# Altium integrated library Weidmueller_OMNIMATE_Power.IntLib: 508 symbols (part 1 of 9) (continued)
## 1043310000 (continued)
OMNIMATE Power - series BL/SL 7.62HP; PartNumber: 1043310000; Manufacturer: Weidmueller; Short_text_for_material: BLL 7.62HP/02/90F 3.2SN OR BX; Side_termination_characteristic: Flange; Mounting_onto_the_PCB: Solder connection; Pitch_mm: 7.62 mm; Pitch_inch: 0.3 inch; No_of_poles: 2; Outgoing_elbow: 90°; Solder_pin_length_mm: 3.2 mm; Contact_surface: tinned; Insulating_material: PA GF; UL_94_flammability_rating: V-0; Rated_voltage_for_surge_voltage_class_pollution_degree_II_2: 630 V; Rated_current_min_no_of_poles_TU_20_deg_C: 24 A; Rated_voltage_use_group_B_UL_1059: 300 V; Rated_current_use_group_B_UL_1059: 20 A; PackageReference: BLL_7_62HP_90F_02; Colour: Orange; Packaging: Box; Qty: 72 PCS; Revision: V1; ComponentLink1Description: Manufacturer URL; ComponentLink1URL: http://www.weidmueller.com/; ComponentLink2Description: URL Link1; ComponentLink2URL: http://catalog.weidmueller.com/catalog/Start.do?localeId=en&ObjectID=1043310000
footprint BLL_7_62HP_90F_02 (OMNIMATE Power - Serie BL/SL 7.62HP  BLL 7.62HP/02/90F 3.2)
pins: A1, A2

## 1043310000_Single
designator J?
OMNIMATE Power - series BL/SL 7.62HP; PartNumber: 1043310000; Manufacturer: Weidmueller; Short_text_for_material: BLL 7.62HP/02/90F 3.2SN OR BX; Side_termination_characteristic: Flange; Mounting_onto_the_PCB: Solder connection; Pitch_mm: 7.62 mm; Pitch_inch: 0.3 inch; No_of_poles: 2; Outgoing_elbow: 90°; Solder_pin_length_mm: 3.2 mm; Contact_surface: tinned; Insulating_material: PA GF; UL_94_flammability_rating: V-0; Rated_voltage_for_surge_voltage_class_pollution_degree_II_2: 630 V; Rated_current_min_no_of_poles_TU_20_deg_C: 24 A; Rated_voltage_use_group_B_UL_1059: 300 V; Rated_current_use_group_B_UL_1059: 20 A; PackageReference: BLL_7_62HP_90F_02; Colour: Orange; Packaging: Box; Qty: 72 PCS; Revision: V1; ComponentLink1Description: Manufacturer URL; ComponentLink1URL: http://www.weidmueller.com/; ComponentLink2Description: URL Link1; ComponentLink2URL: http://catalog.weidmueller.com/catalog/Start.do?localeId=en&ObjectID=1043310000
footprint BLL_7_62HP_90F_02 (OMNIMATE Power - Serie BL/SL 7.62HP  BLL 7.62HP/02/90F 3.2)
part A pins: A1
part B pins: A2

## 1043320000
designator J?
OMNIMATE Power - series BL/SL 7.62HP; PartNumber: 1043320000; Manufacturer: Weidmueller; Short_text_for_material: BLL 7.62HP/03/90F 3.2SN OR BX; Side_termination_characteristic: Flange; Mounting_onto_the_PCB: Solder connection; Pitch_mm: 7.62 mm; Pitch_inch: 0.3 inch; No_of_poles: 3; Outgoing_elbow: 90°; Solder_pin_length_mm: 3.2 mm; Contact_surface: tinned; Insulating_material: PA GF; UL_94_flammability_rating: V-0; Rated_voltage_for_surge_voltage_class_pollution_degree_II_2: 630 V; Rated_current_min_no_of_poles_TU_20_deg_C: 24 A; Rated_voltage_use_group_B_UL_1059: 300 V; Rated_current_use_group_B_UL_1059: 20 A; PackageReference: BLL_7_62HP_90F_03; Colour: Orange; Packaging: Box; Qty: 54 PCS; Revision: V1; ComponentLink1Description: Manufacturer URL; ComponentLink1URL: http://www.weidmueller.com/; ComponentLink2Description: URL Link1; ComponentLink2URL: http://catalog.weidmueller.com/catalog/Start.do?localeId=en&ObjectID=1043320000
footprint BLL_7_62HP_90F_03 (OMNIMATE Power - Serie BL/SL 7.62HP  BLL 7.62HP/03/90F 3.2)
pins: A1, A2, A3

## 1043320000_Single
designator J?
OMNIMATE Power - series BL/SL 7.62HP; PartNumber: 1043320000; Manufacturer: Weidmueller; Short_text_for_material: BLL 7.62HP/03/90F 3.2SN OR BX; Side_termination_characteristic: Flange; Mounting_onto_the_PCB: Solder connection; Pitch_mm: 7.62 mm; Pitch_inch: 0.3 inch; No_of_poles: 3; Outgoing_elbow: 90°; Solder_pin_length_mm: 3.2 mm; Contact_surface: tinned; Insulating_material: PA GF; UL_94_flammability_rating: V-0; Rated_voltage_for_surge_voltage_class_pollution_degree_II_2: 630 V; Rated_current_min_no_of_poles_TU_20_deg_C: 24 A; Rated_voltage_use_group_B_UL_1059: 300 V; Rated_current_use_group_B_UL_1059: 20 A; PackageReference: BLL_7_62HP_90F_03; Colour: Orange; Packaging: Box; Qty: 54 PCS; Revision: V1; ComponentLink1Description: Manufacturer URL; ComponentLink1URL: http://www.weidmueller.com/; ComponentLink2Description: URL Link1; ComponentLink2URL: http://catalog.weidmueller.com/catalog/Start.do?localeId=en&ObjectID=1043320000
footprint BLL_7_62HP_90F_03 (OMNIMATE Power - Serie BL/SL 7.62HP  BLL 7.62HP/03/90F 3.2)
part A pins: A1
part B pins: A2
part C pins: A3

## 1043330000
designator J?
OMNIMATE Power - series BL/SL 7.62HP; PartNumber: 1043330000; Manufacturer: Weidmueller; Short_text_for_material: BLL 7.62HP/04/90F 3.2SN OR BX; Side_termination_characteristic: Flange; Mounting_onto_the_PCB: Solder connection; Pitch_mm: 7.62 mm; Pitch_inch: 0.3 inch; No_of_poles: 4; Outgoing_elbow: 90°; Solder_pin_length_mm: 3.2 mm; Contact_surface: tinned; Insulating_material: PA GF; UL_94_flammability_rating: V-0; Rated_voltage_for_surge_voltage_class_pollution_degree_II_2: 630 V; Rated_current_min_no_of_poles_TU_20_deg_C: 24 A; Rated_voltage_use_group_B_UL_1059: 300 V; Rated_current_use_group_B_UL_1059: 20 A; PackageReference: BLL_7_62HP_90F_04; Colour: Orange; Packaging: Box; Qty: 42 PCS; Revision: V1; ComponentLink1Description: Manufacturer URL; ComponentLink1URL: http://www.weidmueller.com/; ComponentLink2Description: URL Link1; ComponentLink2URL: http://catalog.weidmueller.com/catalog/Start.do?localeId=en&ObjectID=1043330000
footprint BLL_7_62HP_90F_04 (OMNIMATE Power - Serie BL/SL 7.62HP  BLL 7.62HP/04/90F 3.2)
pins: A1, A2, A3, A4

## 1043330000_Single
designator J?
OMNIMATE Power - series BL/SL 7.62HP; PartNumber: 1043330000; Manufacturer: Weidmueller; Short_text_for_material: BLL 7.62HP/04/90F 3.2SN OR BX; Side_termination_characteristic: Flange; Mounting_onto_the_PCB: Solder connection; Pitch_mm: 7.62 mm; Pitch_inch: 0.3 inch; No_of_poles: 4; Outgoing_elbow: 90°; Solder_pin_length_mm: 3.2 mm; Contact_surface: tinned; Insulating_material: PA GF; UL_94_flammability_rating: V-0; Rated_voltage_for_surge_voltage_class_pollution_degree_II_2: 630 V; Rated_current_min_no_of_poles_TU_20_deg_C: 24 A; Rated_voltage_use_group_B_UL_1059: 300 V; Rated_current_use_group_B_UL_1059: 20 A; PackageReference: BLL_7_62HP_90F_04; Colour: Orange; Packaging: Box; Qty: 42 PCS; Revision: V1; ComponentLink1Description: Manufacturer URL; ComponentLink1URL: http://www.weidmueller.com/; ComponentLink2Description: URL Link1; ComponentLink2URL: http://catalog.weidmueller.com/catalog/Start.do?localeId=en&ObjectID=1043330000
footprint BLL_7_62HP_90F_04 (OMNIMATE Power - Serie BL/SL 7.62HP  BLL 7.62HP/04/90F 3.2)
part A pins: A1
part B pins: A2
part C pins: A3
part D pins: A4

## 1047120000
designator E?
OMNIMATE Power - series LXXX; PartNumber: 1047120000; Manufacturer: Weidmueller; Short_text_for_material: LXXX 15.00/01/90 4.5SN BK BX; Side_termination_characteristic: closed side; Mounting_onto_the_PCB: Solder connection; Pitch_mm: 15 mm; Pitch_inch: 0,591 inch; No_of_poles: 1; Solder_pin_length_mm: 4,5 mm; Contact_material: Cu-Leg; Contact_surface: tinned; Insulating_material: Wemid (PA); UL_94_flammability_rating: V-0; Rated_voltage_for_surge_voltage_class_pollution_degree_II_2: 1000 V; Solid_min_H05_07_V_U: 0,5 mm²; Solid_max_H05_07_V_U: 16 mm²; Rated_voltage_use_group_B_UL_1059: 600 V; Rated_current_use_group_B_UL_1059: 127 A; Wire_cross_section_AWG_min_UL_1059: AWG 20; Wire_cross_section_AWG_max_UL_1059: AWG 1; PackageReference: LXXX_15_00_90_01; Colour: Black; Packaging: Box; Qty: 20 PCS; Revision: V1; ComponentLink1Description: Manufacturer URL; ComponentLink1URL: http://www.weidmueller.com/; ComponentLink2Description: URL Link1; ComponentLink2URL: http://catalog.weidmueller.com/catalog/Start.do?localeId=en&ObjectID=1047120000
footprint LXXX_15_00_90_01 (OMNIMATE Power - Serie LXXX  LXXX 15.00/01/90 4.5)
pins: A1
1 alternate drawing of the same symbol

## 1047130000
designator E?
OMNIMATE Power - series LXXX; PartNumber: 1047130000; Manufacturer: Weidmueller; Short_text_for_material: LXXX 15.00/02/90 4.5SN BK BX; Side_termination_characteristic: closed side; Mounting_onto_the_PCB: Solder connection; Pitch_mm: 15 mm; Pitch_inch: 0,591 inch; No_of_poles: 2; Solder_pin_length_mm: 4,5 mm; Contact_material: Cu-Leg; Contact_surface: tinned; Insulating_material: Wemid (PA); UL_94_flammability_rating: V-0; Rated_voltage_for_surge_voltage_class_pollution_degree_II_2: 1000 V; Solid_min_H05_07_V_U: 0,5 mm²; Solid_max_H05_07_V_U: 16 mm²; Rated_voltage_use_group_B_UL_1059: 600 V; Rated_current_use_group_B_UL_1059: 127 A; Wire_cross_section_AWG_min_UL_1059: AWG 20; Wire_cross_section_AWG_max_UL_1059: AWG 1; PackageReference: LXXX_15_00_90_02; Colour: Black; Packaging: Box; Qty: 20 PCS; Revision: V1; ComponentLink1Description: Manufacturer URL; ComponentLink1URL: http://www.weidmueller.com/; ComponentLink2Description: URL Link1; ComponentLink2URL: http://catalog.weidmueller.com/catalog/Start.do?localeId=en&ObjectID=1047130000
footprint LXXX_15_00_90_02 (OMNIMATE Power - Serie LXXX  LXXX 15.00/02/90 4.5)
pins: A1, A2
1 alternate drawing of the same symbol

## 1047130000_Single
designator E?
OMNIMATE Power - series LXXX; PartNumber: 1047130000; Manufacturer: Weidmueller; Short_text_for_material: LXXX 15.00/02/90 4.5SN BK BX; Side_termination_characteristic: closed side; Mounting_onto_the_PCB: Solder connection; Pitch_mm: 15 mm; Pitch_inch: 0,591 inch; No_of_poles: 2; Solder_pin_length_mm: 4,5 mm; Contact_material: Cu-Leg; Contact_surface: tinned; Insulating_material: Wemid (PA); UL_94_flammability_rating: V-0; Rated_voltage_for_surge_voltage_class_pollution_degree_II_2: 1000 V; Solid_min_H05_07_V_U: 0,5 mm²; Solid_max_H05_07_V_U: 16 mm²; Rated_voltage_use_group_B_UL_1059: 600 V; Rated_current_use_group_B_UL_1059: 127 A; Wire_cross_section_AWG_min_UL_1059: AWG 20; Wire_cross_section_AWG_max_UL_1059: AWG 1; PackageReference: LXXX_15_00_90_02; Colour: Black; Packaging: Box; Qty: 20 PCS; Revision: V1; ComponentLink1Description: Manufacturer URL; ComponentLink1URL: http://www.weidmueller.com/; ComponentLink2Description: URL Link1; ComponentLink2URL: http://catalog.weidmueller.com/catalog/Start.do?localeId=en&ObjectID=1047130000
footprint LXXX_15_00_90_02 (OMNIMATE Power - Serie LXXX  LXXX 15.00/02/90 4.5)
part A pins: A1
part B pins: A2
1 alternate drawing of the same symbol

## 1047140000
designator E?
OMNIMATE Power - series LXXX; PartNumber: 1047140000; Manufacturer: Weidmueller; Short_text_for_material: LXXX 15.00/03/90 4.5SN BK BX; Side_termination_characteristic: closed side; Mounting_onto_the_PCB: Solder connection; Pitch_mm: 15 mm; Pitch_inch: 0,591 inch; No_of_poles: 3; Solder_pin_length_mm: 4,5 mm; Contact_material: Cu-Leg; Contact_surface: tinned; Insulating_material: Wemid (PA); UL_94_flammability_rating: V-0; Rated_voltage_for_surge_voltage_class_pollution_degree_II_2: 1000 V; Solid_min_H05_07_V_U: 0,5 mm²; Solid_max_H05_07_V_U: 16 mm²; Rated_voltage_use_group_B_UL_1059: 600 V; Rated_current_use_group_B_UL_1059: 127 A; Wire_cross_section_AWG_min_UL_1059: AWG 20; Wire_cross_section_AWG_max_UL_1059: AWG 1; PackageReference: LXXX_15_00_90_03; Colour: Black; Packaging: Box; Qty: 10 PCS; Revision: V1; ComponentLink1Description: Manufacturer URL; ComponentLink1URL: http://www.weidmueller.com/; ComponentLink2Description: URL Link1; ComponentLink2URL: http://catalog.weidmueller.com/catalog/Start.do?localeId=en&ObjectID=1047140000
footprint LXXX_15_00_90_03 (OMNIMATE Power - Serie LXXX  LXXX 15.00/03/90 4.5)
pins: A1, A2, A3
1 alternate drawing of the same symbol

## 1047140000_Single
designator E?
OMNIMATE Power - series LXXX; PartNumber: 1047140000; Manufacturer: Weidmueller; Short_text_for_material: LXXX 15.00/03/90 4.5SN BK BX; Side_termination_characteristic: closed side; Mounting_onto_the_PCB: Solder connection; Pitch_mm: 15 mm; Pitch_inch: 0,591 inch; No_of_poles: 3; Solder_pin_length_mm: 4,5 mm; Contact_material: Cu-Leg; Contact_surface: tinned; Insulating_material: Wemid (PA); UL_94_flammability_rating: V-0; Rated_voltage_for_surge_voltage_class_pollution_degree_II_2: 1000 V; Solid_min_H05_07_V_U: 0,5 mm²; Solid_max_H05_07_V_U: 16 mm²; Rated_voltage_use_group_B_UL_1059: 600 V; Rated_current_use_group_B_UL_1059: 127 A; Wire_cross_section_AWG_min_UL_1059: AWG 20; Wire_cross_section_AWG_max_UL_1059: AWG 1; PackageReference: LXXX_15_00_90_03; Colour: Black; Packaging: Box; Qty: 10 PCS; Revision: V1; ComponentLink1Description: Manufacturer URL; ComponentLink1URL: http://www.weidmueller.com/; ComponentLink2Description: URL Link1; ComponentLink2URL: http://catalog.weidmueller.com/catalog/Start.do?localeId=en&ObjectID=1047140000
footprint LXXX_15_00_90_03 (OMNIMATE Power - Serie LXXX  LXXX 15.00/03/90 4.5)
part A pins: A1
part B pins: A2
part C pins: A3
1 alternate drawing of the same symbol

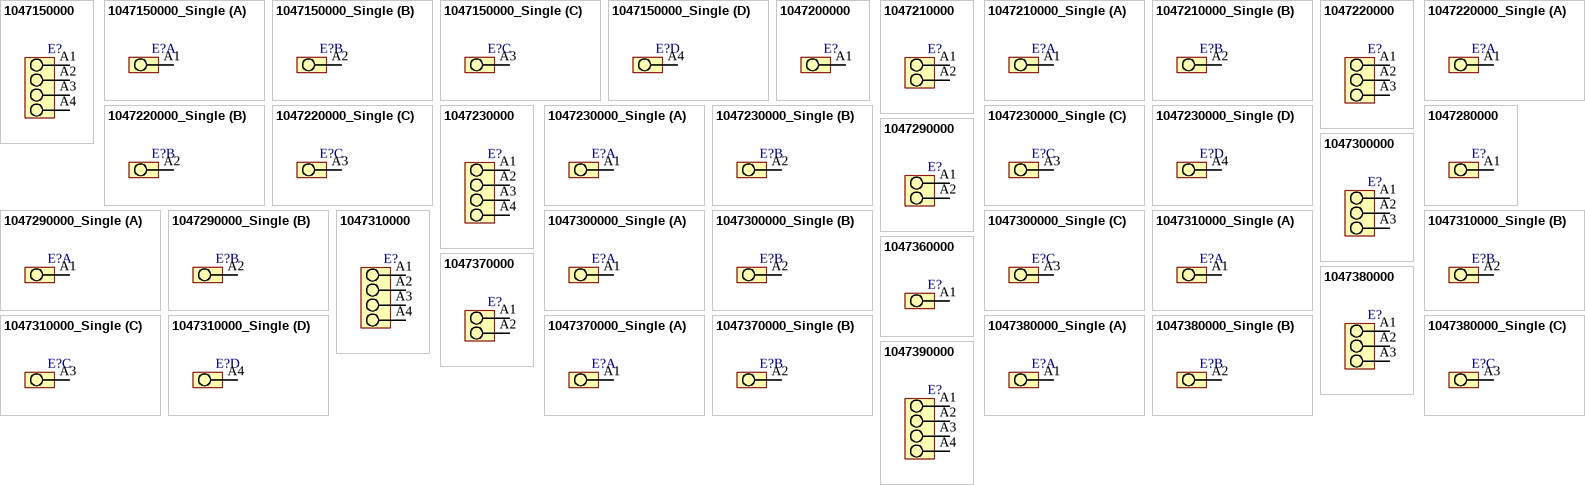
[diagram p2: symbols 1047150000 to 1047390000]

## 1047150000
designator E?
OMNIMATE Power - series LXXX; PartNumber: 1047150000; Manufacturer: Weidmueller; Short_text_for_material: LXXX 15.00/04/90 4.5SN BK BX; Side_termination_characteristic: closed side; Mounting_onto_the_PCB: Solder connection; Pitch_mm: 15 mm; Pitch_inch: 0,591 inch; No_of_poles: 4; Solder_pin_length_mm: 4,5 mm; Contact_material: Cu-Leg; Contact_surface: tinned; Insulating_material: Wemid (PA); UL_94_flammability_rating: V-0; Rated_voltage_for_surge_voltage_class_pollution_degree_II_2: 1000 V; Solid_min_H05_07_V_U: 0,5 mm²; Solid_max_H05_07_V_U: 16 mm²; Rated_voltage_use_group_B_UL_1059: 600 V; Rated_current_use_group_B_UL_1059: 127 A; Wire_cross_section_AWG_min_UL_1059: AWG 20; Wire_cross_section_AWG_max_UL_1059: AWG 1; PackageReference: LXXX_15_00_90_04; Colour: Black; Packaging: Box; Qty: 10 PCS; Revision: V1; ComponentLink1Description: Manufacturer URL; ComponentLink1URL: http://www.weidmueller.com/; ComponentLink2Description: URL Link1; ComponentLink2URL: http://catalog.weidmueller.com/catalog/Start.do?localeId=en&ObjectID=1047150000
footprint LXXX_15_00_90_04 (OMNIMATE Power - Serie LXXX  LXXX 15.00/04/90 4.5)
pins: A1, A2, A3, A4
1 alternate drawing of the same symbol

## 1047150000_Single
designator E?
OMNIMATE Power - series LXXX; PartNumber: 1047150000; Manufacturer: Weidmueller; Short_text_for_material: LXXX 15.00/04/90 4.5SN BK BX; Side_termination_characteristic: closed side; Mounting_onto_the_PCB: Solder connection; Pitch_mm: 15 mm; Pitch_inch: 0,591 inch; No_of_poles: 4; Solder_pin_length_mm: 4,5 mm; Contact_material: Cu-Leg; Contact_surface: tinned; Insulating_material: Wemid (PA); UL_94_flammability_rating: V-0; Rated_voltage_for_surge_voltage_class_pollution_degree_II_2: 1000 V; Solid_min_H05_07_V_U: 0,5 mm²; Solid_max_H05_07_V_U: 16 mm²; Rated_voltage_use_group_B_UL_1059: 600 V; Rated_current_use_group_B_UL_1059: 127 A; Wire_cross_section_AWG_min_UL_1059: AWG 20; Wire_cross_section_AWG_max_UL_1059: AWG 1; PackageReference: LXXX_15_00_90_04; Colour: Black; Packaging: Box; Qty: 10 PCS; Revision: V1; ComponentLink1Description: Manufacturer URL; ComponentLink1URL: http://www.weidmueller.com/; ComponentLink2Description: URL Link1; ComponentLink2URL: http://catalog.weidmueller.com/catalog/Start.do?localeId=en&ObjectID=1047150000
footprint LXXX_15_00_90_04 (OMNIMATE Power - Serie LXXX  LXXX 15.00/04/90 4.5)
part A pins: A1
part B pins: A2
part C pins: A3
part D pins: A4
1 alternate drawing of the same symbol

## 1047200000
designator E?
OMNIMATE Power - series LXXX; PartNumber: 1047200000; Manufacturer: Weidmueller; Short_text_for_material: LXXX 15.00/01/90 4.5SN GY BX; Side_termination_characteristic: closed side; Mounting_onto_the_PCB: Solder connection; Pitch_mm: 15 mm; Pitch_inch: 0,591 inch; No_of_poles: 1; Solder_pin_length_mm: 4,5 mm; Contact_material: Cu-Leg; Contact_surface: tinned; Insulating_material: Wemid (PA); UL_94_flammability_rating: V-0; Rated_voltage_for_surge_voltage_class_pollution_degree_II_2: 1000 V; Rated_current_min_no_of_poles_TU_20_deg_C: 150 A; Solid_min_H05_07_V_U: 0,5 mm²; Solid_max_H05_07_V_U: 16 mm²; Rated_voltage_use_group_B_UL_1059: 600 V; Rated_current_use_group_B_UL_1059: 127 A; Wire_cross_section_AWG_min_UL_1059: AWG 20; Wire_cross_section_AWG_max_UL_1059: AWG 1; PackageReference: LXXX_15_00_90_01; Colour: Pebble grey; Packaging: Box; Qty: 20 PCS; Revision: V1; ComponentLink1Description: Manufacturer URL; ComponentLink1URL: http://www.weidmueller.com/; ComponentLink2Description: URL Link1; ComponentLink2URL: http://catalog.weidmueller.com/catalog/Start.do?localeId=en&ObjectID=1047200000
footprint LXXX_15_00_90_01 (OMNIMATE Power - Serie LXXX  LXXX 15.00/01/90 4.5)
pins: A1
1 alternate drawing of the same symbol

## 1047210000
designator E?
OMNIMATE Power - series LXXX; PartNumber: 1047210000; Manufacturer: Weidmueller; Short_text_for_material: LXXX 15.00/02/90 4.5SN GY BX; Side_termination_characteristic: closed side; Mounting_onto_the_PCB: Solder connection; Pitch_mm: 15 mm; Pitch_inch: 0,591 inch; No_of_poles: 2; Solder_pin_length_mm: 4,5 mm; Contact_material: Cu-Leg; Contact_surface: tinned; Insulating_material: Wemid (PA); UL_94_flammability_rating: V-0; Rated_voltage_for_surge_voltage_class_pollution_degree_II_2: 1000 V; Rated_current_min_no_of_poles_TU_20_deg_C: 150 A; Solid_min_H05_07_V_U: 0,5 mm²; Solid_max_H05_07_V_U: 16 mm²; Rated_voltage_use_group_B_UL_1059: 600 V; Rated_current_use_group_B_UL_1059: 127 A; Wire_cross_section_AWG_min_UL_1059: AWG 20; Wire_cross_section_AWG_max_UL_1059: AWG 1; PackageReference: LXXX_15_00_90_02; Colour: Pebble grey; Packaging: Box; Qty: 20 PCS; Revision: V1; ComponentLink1Description: Manufacturer URL; ComponentLink1URL: http://www.weidmueller.com/; ComponentLink2Description: URL Link1; ComponentLink2URL: http://catalog.weidmueller.com/catalog/Start.do?localeId=en&ObjectID=1047210000
footprint LXXX_15_00_90_02 (OMNIMATE Power - Serie LXXX  LXXX 15.00/02/90 4.5)
pins: A1, A2
1 alternate drawing of the same symbol

## 1047210000_Single
designator E?
OMNIMATE Power - series LXXX; PartNumber: 1047210000; Manufacturer: Weidmueller; Short_text_for_material: LXXX 15.00/02/90 4.5SN GY BX; Side_termination_characteristic: closed side; Mounting_onto_the_PCB: Solder connection; Pitch_mm: 15 mm; Pitch_inch: 0,591 inch; No_of_poles: 2; Solder_pin_length_mm: 4,5 mm; Contact_material: Cu-Leg; Contact_surface: tinned; Insulating_material: Wemid (PA); UL_94_flammability_rating: V-0; Rated_voltage_for_surge_voltage_class_pollution_degree_II_2: 1000 V; Rated_current_min_no_of_poles_TU_20_deg_C: 150 A; Solid_min_H05_07_V_U: 0,5 mm²; Solid_max_H05_07_V_U: 16 mm²; Rated_voltage_use_group_B_UL_1059: 600 V; Rated_current_use_group_B_UL_1059: 127 A; Wire_cross_section_AWG_min_UL_1059: AWG 20; Wire_cross_section_AWG_max_UL_1059: AWG 1; PackageReference: LXXX_15_00_90_02; Colour: Pebble grey; Packaging: Box; Qty: 20 PCS; Revision: V1; ComponentLink1Description: Manufacturer URL; ComponentLink1URL: http://www.weidmueller.com/; ComponentLink2Description: URL Link1; ComponentLink2URL: http://catalog.weidmueller.com/catalog/Start.do?localeId=en&ObjectID=1047210000
footprint LXXX_15_00_90_02 (OMNIMATE Power - Serie LXXX  LXXX 15.00/02/90 4.5)
part A pins: A1
part B pins: A2
1 alternate drawing of the same symbol

## 1047220000
designator E?
OMNIMATE Power - series LXXX; PartNumber: 1047220000; Manufacturer: Weidmueller; Short_text_for_material: LXXX 15.00/03/90 4.5SN GY BX; Side_termination_characteristic: closed side; Mounting_onto_the_PCB: Solder connection; Pitch_mm: 15 mm; Pitch_inch: 0,591 inch; No_of_poles: 3; Solder_pin_length_mm: 4,5 mm; Contact_material: Cu-Leg; Contact_surface: tinned; Insulating_material: Wemid (PA); UL_94_flammability_rating: V-0; Rated_voltage_for_surge_voltage_class_pollution_degree_II_2: 1000 V; Rated_current_min_no_of_poles_TU_20_deg_C: 150 A; Solid_min_H05_07_V_U: 0,5 mm²; Solid_max_H05_07_V_U: 16 mm²; Rated_voltage_use_group_B_UL_1059: 600 V; Rated_current_use_group_B_UL_1059: 127 A; Wire_cross_section_AWG_min_UL_1059: AWG 20; Wire_cross_section_AWG_max_UL_1059: AWG 1; PackageReference: LXXX_15_00_90_03; Colour: Pebble grey; Packaging: Box; Qty: 10 PCS; Revision: V1; ComponentLink1Description: Manufacturer URL; ComponentLink1URL: http://www.weidmueller.com/; ComponentLink2Description: URL Link1; ComponentLink2URL: http://catalog.weidmueller.com/catalog/Start.do?localeId=en&ObjectID=1047220000
footprint LXXX_15_00_90_03 (OMNIMATE Power - Serie LXXX  LXXX 15.00/03/90 4.5)
pins: A1, A2, A3
1 alternate drawing of the same symbol

## 1047220000_Single
designator E?
OMNIMATE Power - series LXXX; PartNumber: 1047220000; Manufacturer: Weidmueller; Short_text_for_material: LXXX 15.00/03/90 4.5SN GY BX; Side_termination_characteristic: closed side; Mounting_onto_the_PCB: Solder connection; Pitch_mm: 15 mm; Pitch_inch: 0,591 inch; No_of_poles: 3; Solder_pin_length_mm: 4,5 mm; Contact_material: Cu-Leg; Contact_surface: tinned; Insulating_material: Wemid (PA); UL_94_flammability_rating: V-0; Rated_voltage_for_surge_voltage_class_pollution_degree_II_2: 1000 V; Rated_current_min_no_of_poles_TU_20_deg_C: 150 A; Solid_min_H05_07_V_U: 0,5 mm²; Solid_max_H05_07_V_U: 16 mm²; Rated_voltage_use_group_B_UL_1059: 600 V; Rated_current_use_group_B_UL_1059: 127 A; Wire_cross_section_AWG_min_UL_1059: AWG 20; Wire_cross_section_AWG_max_UL_1059: AWG 1; PackageReference: LXXX_15_00_90_03; Colour: Pebble grey; Packaging: Box; Qty: 10 PCS; Revision: V1; ComponentLink1Description: Manufacturer URL; ComponentLink1URL: http://www.weidmueller.com/; ComponentLink2Description: URL Link1; ComponentLink2URL: http://catalog.weidmueller.com/catalog/Start.do?localeId=en&ObjectID=1047220000
footprint LXXX_15_00_90_03 (OMNIMATE Power - Serie LXXX  LXXX 15.00/03/90 4.5)
part A pins: A1
part B pins: A2
part C pins: A3
1 alternate drawing of the same symbol

## 1047230000
designator E?
OMNIMATE Power - series LXXX; PartNumber: 1047230000; Manufacturer: Weidmueller; Short_text_for_material: LXXX 15.00/04/90 4.5SN GY BX; Side_termination_characteristic: closed side; Mounting_onto_the_PCB: Solder connection; Pitch_mm: 15 mm; Pitch_inch: 0,591 inch; No_of_poles: 4; Solder_pin_length_mm: 4,5 mm; Contact_material: Cu-Leg; Contact_surface: tinned; Insulating_material: Wemid (PA); UL_94_flammability_rating: V-0; Rated_voltage_for_surge_voltage_class_pollution_degree_II_2: 1000 V; Rated_current_min_no_of_poles_TU_20_deg_C: 150 A; Solid_min_H05_07_V_U: 0,5 mm²; Solid_max_H05_07_V_U: 16 mm²; Rated_voltage_use_group_B_UL_1059: 600 V; Rated_current_use_group_B_UL_1059: 127 A; Wire_cross_section_AWG_min_UL_1059: AWG 20; Wire_cross_section_AWG_max_UL_1059: AWG 1; PackageReference: LXXX_15_00_90_04; Colour: Pebble grey; Packaging: Box; Qty: 10 PCS; Revision: V1; ComponentLink1Description: Manufacturer URL; ComponentLink1URL: http://www.weidmueller.com/; ComponentLink2Description: URL Link1; ComponentLink2URL: http://catalog.weidmueller.com/catalog/Start.do?localeId=en&ObjectID=1047230000
footprint LXXX_15_00_90_04 (OMNIMATE Power - Serie LXXX  LXXX 15.00/04/90 4.5)
pins: A1, A2, A3, A4
1 alternate drawing of the same symbol

## 1047230000_Single
designator E?
OMNIMATE Power - series LXXX; PartNumber: 1047230000; Manufacturer: Weidmueller; Short_text_for_material: LXXX 15.00/04/90 4.5SN GY BX; Side_termination_characteristic: closed side; Mounting_onto_the_PCB: Solder connection; Pitch_mm: 15 mm; Pitch_inch: 0,591 inch; No_of_poles: 4; Solder_pin_length_mm: 4,5 mm; Contact_material: Cu-Leg; Contact_surface: tinned; Insulating_material: Wemid (PA); UL_94_flammability_rating: V-0; Rated_voltage_for_surge_voltage_class_pollution_degree_II_2: 1000 V; Rated_current_min_no_of_poles_TU_20_deg_C: 150 A; Solid_min_H05_07_V_U: 0,5 mm²; Solid_max_H05_07_V_U: 16 mm²; Rated_voltage_use_group_B_UL_1059: 600 V; Rated_current_use_group_B_UL_1059: 127 A; Wire_cross_section_AWG_min_UL_1059: AWG 20; Wire_cross_section_AWG_max_UL_1059: AWG 1; PackageReference: LXXX_15_00_90_04; Colour: Pebble grey; Packaging: Box; Qty: 10 PCS; Revision: V1; ComponentLink1Description: Manufacturer URL; ComponentLink1URL: http://www.weidmueller.com/; ComponentLink2Description: URL Link1; ComponentLink2URL: http://catalog.weidmueller.com/catalog/Start.do?localeId=en&ObjectID=1047230000
footprint LXXX_15_00_90_04 (OMNIMATE Power - Serie LXXX  LXXX 15.00/04/90 4.5)
part A pins: A1
part B pins: A2
part C pins: A3
part D pins: A4
1 alternate drawing of the same symbol

## 1047280000
designator E?
OMNIMATE Power - series LXXX; PartNumber: 1047280000; Manufacturer: Weidmueller; Short_text_for_material: LXXX 15.00/01/90F 4.5SN BK BX; Side_termination_characteristic: Flange; Mounting_onto_the_PCB: Solder connection; Pitch_mm: 15 mm; Pitch_inch: 0,591 inch; No_of_poles: 1; Solder_pin_length_mm: 4,5 mm; Contact_material: Cu-Leg; Contact_surface: tinned; Insulating_material: Wemid (PA); UL_94_flammability_rating: V-0; Rated_voltage_for_surge_voltage_class_pollution_degree_II_2: 1000 V; Solid_min_H05_07_V_U: 0,5 mm²; Solid_max_H05_07_V_U: 16 mm²; Rated_voltage_use_group_B_UL_1059: 600 V; Rated_current_use_group_B_UL_1059: 127 A; Wire_cross_section_AWG_min_UL_1059: AWG 20; Wire_cross_section_AWG_max_UL_1059: AWG 1; PackageReference: LXXX_15_00_90F_01; Colour: Black; Packaging: Box; Qty: 20 PCS; Revision: V1; ComponentLink1Description: Manufacturer URL; ComponentLink1URL: http://www.weidmueller.com/; ComponentLink2Description: URL Link1; ComponentLink2URL: http://catalog.weidmueller.com/catalog/Start.do?localeId=en&ObjectID=1047280000
footprint LXXX_15_00_90F_01 (OMNIMATE Power - Serie LXXX  LXXX 15.00/01/90F 4.5)
pins: A1
1 alternate drawing of the same symbol

## 1047290000
designator E?
OMNIMATE Power - series LXXX; PartNumber: 1047290000; Manufacturer: Weidmueller; Short_text_for_material: LXXX 15.00/02/90F 4.5SN BK BX; Side_termination_characteristic: Flange; Mounting_onto_the_PCB: Solder connection; Pitch_mm: 15 mm; Pitch_inch: 0,591 inch; No_of_poles: 2; Solder_pin_length_mm: 4,5 mm; Contact_material: Cu-Leg; Contact_surface: tinned; Insulating_material: Wemid (PA); UL_94_flammability_rating: V-0; Rated_voltage_for_surge_voltage_class_pollution_degree_II_2: 1000 V; Solid_min_H05_07_V_U: 0,5 mm²; Solid_max_H05_07_V_U: 16 mm²; Rated_voltage_use_group_B_UL_1059: 600 V; Rated_current_use_group_B_UL_1059: 127 A; Wire_cross_section_AWG_min_UL_1059: AWG 20; Wire_cross_section_AWG_max_UL_1059: AWG 1; PackageReference: LXXX_15_00_90F_02; Colour: Black; Packaging: Box; Qty: 20 PCS; Revision: V1; ComponentLink1Description: Manufacturer URL; ComponentLink1URL: http://www.weidmueller.com/; ComponentLink2Description: URL Link1; ComponentLink2URL: http://catalog.weidmueller.com/catalog/Start.do?localeId=en&ObjectID=1047290000
footprint LXXX_15_00_90F_02 (OMNIMATE Power - Serie LXXX  LXXX 15.00/02/90F 4.5)
pins: A1, A2
1 alternate drawing of the same symbol

## 1047290000_Single
designator E?
OMNIMATE Power - series LXXX; PartNumber: 1047290000; Manufacturer: Weidmueller; Short_text_for_material: LXXX 15.00/02/90F 4.5SN BK BX; Side_termination_characteristic: Flange; Mounting_onto_the_PCB: Solder connection; Pitch_mm: 15 mm; Pitch_inch: 0,591 inch; No_of_poles: 2; Solder_pin_length_mm: 4,5 mm; Contact_material: Cu-Leg; Contact_surface: tinned; Insulating_material: Wemid (PA); UL_94_flammability_rating: V-0; Rated_voltage_for_surge_voltage_class_pollution_degree_II_2: 1000 V; Solid_min_H05_07_V_U: 0,5 mm²; Solid_max_H05_07_V_U: 16 mm²; Rated_voltage_use_group_B_UL_1059: 600 V; Rated_current_use_group_B_UL_1059: 127 A; Wire_cross_section_AWG_min_UL_1059: AWG 20; Wire_cross_section_AWG_max_UL_1059: AWG 1; PackageReference: LXXX_15_00_90F_02; Colour: Black; Packaging: Box; Qty: 20 PCS; Revision: V1; ComponentLink1Description: Manufacturer URL; ComponentLink1URL: http://www.weidmueller.com/; ComponentLink2Description: URL Link1; ComponentLink2URL: http://catalog.weidmueller.com/catalog/Start.do?localeId=en&ObjectID=1047290000
footprint LXXX_15_00_90F_02 (OMNIMATE Power - Serie LXXX  LXXX 15.00/02/90F 4.5)
part A pins: A1
part B pins: A2
1 alternate drawing of the same symbol

## 1047300000
designator E?
OMNIMATE Power - series LXXX; PartNumber: 1047300000; Manufacturer: Weidmueller; Short_text_for_material: LXXX 15.00/03/90F 4.5SN BK BX; Side_termination_characteristic: Flange; Mounting_onto_the_PCB: Solder connection; Pitch_mm: 15 mm; Pitch_inch: 0,591 inch; No_of_poles: 3; Solder_pin_length_mm: 4,5 mm; Contact_material: Cu-Leg; Contact_surface: tinned; Insulating_material: Wemid (PA); UL_94_flammability_rating: V-0; Rated_voltage_for_surge_voltage_class_pollution_degree_II_2: 1000 V; Solid_min_H05_07_V_U: 0,5 mm²; Solid_max_H05_07_V_U: 16 mm²; Rated_voltage_use_group_B_UL_1059: 600 V; Rated_current_use_group_B_UL_1059: 127 A; Wire_cross_section_AWG_min_UL_1059: AWG 20; Wire_cross_section_AWG_max_UL_1059: AWG 1; PackageReference: LXXX_15_00_90F_03; Colour: Black; Packaging: Box; Qty: 10 PCS; Revision: V1; ComponentLink1Description: Manufacturer URL; ComponentLink1URL: http://www.weidmueller.com/; ComponentLink2Description: URL Link1; ComponentLink2URL: http://catalog.weidmueller.com/catalog/Start.do?localeId=en&ObjectID=1047300000
footprint LXXX_15_00_90F_03 (OMNIMATE Power - Serie LXXX  LXXX 15.00/03/90F 4.5)
pins: A1, A2, A3
1 alternate drawing of the same symbol

## 1047300000_Single
designator E?
OMNIMATE Power - series LXXX; PartNumber: 1047300000; Manufacturer: Weidmueller; Short_text_for_material: LXXX 15.00/03/90F 4.5SN BK BX; Side_termination_characteristic: Flange; Mounting_onto_the_PCB: Solder connection; Pitch_mm: 15 mm; Pitch_inch: 0,591 inch; No_of_poles: 3; Solder_pin_length_mm: 4,5 mm; Contact_material: Cu-Leg; Contact_surface: tinned; Insulating_material: Wemid (PA); UL_94_flammability_rating: V-0; Rated_voltage_for_surge_voltage_class_pollution_degree_II_2: 1000 V; Solid_min_H05_07_V_U: 0,5 mm²; Solid_max_H05_07_V_U: 16 mm²; Rated_voltage_use_group_B_UL_1059: 600 V; Rated_current_use_group_B_UL_1059: 127 A; Wire_cross_section_AWG_min_UL_1059: AWG 20; Wire_cross_section_AWG_max_UL_1059: AWG 1; PackageReference: LXXX_15_00_90F_03; Colour: Black; Packaging: Box; Qty: 10 PCS; Revision: V1; ComponentLink1Description: Manufacturer URL; ComponentLink1URL: http://www.weidmueller.com/; ComponentLink2Description: URL Link1; ComponentLink2URL: http://catalog.weidmueller.com/catalog/Start.do?localeId=en&ObjectID=1047300000
footprint LXXX_15_00_90F_03 (OMNIMATE Power - Serie LXXX  LXXX 15.00/03/90F 4.5)
part A pins: A1
part B pins: A2
part C pins: A3
1 alternate drawing of the same symbol

## 1047310000
designator E?
OMNIMATE Power - series LXXX; PartNumber: 1047310000; Manufacturer: Weidmueller; Short_text_for_material: LXXX 15.00/04/90F 4.5SN BK BX; Side_termination_characteristic: Flange; Mounting_onto_the_PCB: Solder connection; Pitch_mm: 15 mm; Pitch_inch: 0,591 inch; No_of_poles: 4; Solder_pin_length_mm: 4,5 mm; Contact_material: Cu-Leg; Contact_surface: tinned; Insulating_material: Wemid (PA); UL_94_flammability_rating: V-0; Rated_voltage_for_surge_voltage_class_pollution_degree_II_2: 1000 V; Solid_min_H05_07_V_U: 0,5 mm²; Solid_max_H05_07_V_U: 16 mm²; Rated_voltage_use_group_B_UL_1059: 600 V; Rated_current_use_group_B_UL_1059: 127 A; Wire_cross_section_AWG_min_UL_1059: AWG 20; Wire_cross_section_AWG_max_UL_1059: AWG 1; PackageReference: LXXX_15_00_90F_04; Colour: Black; Packaging: Box; Qty: 10 PCS; Revision: V1; ComponentLink1Description: Manufacturer URL; ComponentLink1URL: http://www.weidmueller.com/; ComponentLink2Description: URL Link1; ComponentLink2URL: http://catalog.weidmueller.com/catalog/Start.do?localeId=en&ObjectID=1047310000
footprint LXXX_15_00_90F_04 (OMNIMATE Power - Serie LXXX  LXXX 15.00/04/90F 4.5)
pins: A1, A2, A3, A4
1 alternate drawing of the same symbol

## 1047310000_Single
designator E?
OMNIMATE Power - series LXXX; PartNumber: 1047310000; Manufacturer: Weidmueller; Short_text_for_material: LXXX 15.00/04/90F 4.5SN BK BX; Side_termination_characteristic: Flange; Mounting_onto_the_PCB: Solder connection; Pitch_mm: 15 mm; Pitch_inch: 0,591 inch; No_of_poles: 4; Solder_pin_length_mm: 4,5 mm; Contact_material: Cu-Leg; Contact_surface: tinned; Insulating_material: Wemid (PA); UL_94_flammability_rating: V-0; Rated_voltage_for_surge_voltage_class_pollution_degree_II_2: 1000 V; Solid_min_H05_07_V_U: 0,5 mm²; Solid_max_H05_07_V_U: 16 mm²; Rated_voltage_use_group_B_UL_1059: 600 V; Rated_current_use_group_B_UL_1059: 127 A; Wire_cross_section_AWG_min_UL_1059: AWG 20; Wire_cross_section_AWG_max_UL_1059: AWG 1; PackageReference: LXXX_15_00_90F_04; Colour: Black; Packaging: Box; Qty: 10 PCS; Revision: V1; ComponentLink1Description: Manufacturer URL; ComponentLink1URL: http://www.weidmueller.com/; ComponentLink2Description: URL Link1; ComponentLink2URL: http://catalog.weidmueller.com/catalog/Start.do?localeId=en&ObjectID=1047310000
footprint LXXX_15_00_90F_04 (OMNIMATE Power - Serie LXXX  LXXX 15.00/04/90F 4.5)
part A pins: A1
part B pins: A2
part C pins: A3
part D pins: A4
1 alternate drawing of the same symbol

## 1047360000
designator E?
OMNIMATE Power - series LXXX; PartNumber: 1047360000; Manufacturer: Weidmueller; Short_text_for_material: LXXX 15.00/01/90F 4.5SN GY BX; Side_termination_characteristic: Flange; Mounting_onto_the_PCB: Solder connection; Pitch_mm: 15 mm; Pitch_inch: 0,591 inch; No_of_poles: 1; Solder_pin_length_mm: 4,5 mm; Contact_material: Cu-Leg; Contact_surface: tinned; Insulating_material: Wemid (PA); UL_94_flammability_rating: V-0; Rated_voltage_for_surge_voltage_class_pollution_degree_II_2: 1000 V; Rated_current_min_no_of_poles_TU_20_deg_C: 150 A; Solid_min_H05_07_V_U: 0,5 mm²; Solid_max_H05_07_V_U: 16 mm²; Rated_voltage_use_group_B_UL_1059: 600 V; Rated_current_use_group_B_UL_1059: 127 A; Wire_cross_section_AWG_min_UL_1059: AWG 20; Wire_cross_section_AWG_max_UL_1059: AWG 1; PackageReference: LXXX_15_00_90F_01; Colour: Pebble grey; Packaging: Box; Qty: 20 PCS; Revision: V1; ComponentLink1Description: Manufacturer URL; ComponentLink1URL: http://www.weidmueller.com/; ComponentLink2Description: URL Link1; ComponentLink2URL: http://catalog.weidmueller.com/catalog/Start.do?localeId=en&ObjectID=1047360000
footprint LXXX_15_00_90F_01 (OMNIMATE Power - Serie LXXX  LXXX 15.00/01/90F 4.5)
pins: A1
1 alternate drawing of the same symbol

## 1047370000
designator E?
OMNIMATE Power - series LXXX; PartNumber: 1047370000; Manufacturer: Weidmueller; Short_text_for_material: LXXX 15.00/02/90F 4.5SN GY BX; Side_termination_characteristic: Flange; Mounting_onto_the_PCB: Solder connection; Pitch_mm: 15 mm; Pitch_inch: 0,591 inch; No_of_poles: 2; Solder_pin_length_mm: 4,5 mm; Contact_material: Cu-Leg; Contact_surface: tinned; Insulating_material: Wemid (PA); UL_94_flammability_rating: V-0; Rated_voltage_for_surge_voltage_class_pollution_degree_II_2: 1000 V; Rated_current_min_no_of_poles_TU_20_deg_C: 150 A; Solid_min_H05_07_V_U: 0,5 mm²; Solid_max_H05_07_V_U: 16 mm²; Rated_voltage_use_group_B_UL_1059: 600 V; Rated_current_use_group_B_UL_1059: 127 A; Wire_cross_section_AWG_min_UL_1059: AWG 20; Wire_cross_section_AWG_max_UL_1059: AWG 1; PackageReference: LXXX_15_00_90F_02; Colour: Pebble grey; Packaging: Box; Qty: 20 PCS; Revision: V1; ComponentLink1Description: Manufacturer URL; ComponentLink1URL: http://www.weidmueller.com/; ComponentLink2Description: URL Link1; ComponentLink2URL: http://catalog.weidmueller.com/catalog/Start.do?localeId=en&ObjectID=1047370000
footprint LXXX_15_00_90F_02 (OMNIMATE Power - Serie LXXX  LXXX 15.00/02/90F 4.5)
pins: A1, A2
1 alternate drawing of the same symbol

## 1047370000_Single
designator E?
OMNIMATE Power - series LXXX; PartNumber: 1047370000; Manufacturer: Weidmueller; Short_text_for_material: LXXX 15.00/02/90F 4.5SN GY BX; Side_termination_characteristic: Flange; Mounting_onto_the_PCB: Solder connection; Pitch_mm: 15 mm; Pitch_inch: 0,591 inch; No_of_poles: 2; Solder_pin_length_mm: 4,5 mm; Contact_material: Cu-Leg; Contact_surface: tinned; Insulating_material: Wemid (PA); UL_94_flammability_rating: V-0; Rated_voltage_for_surge_voltage_class_pollution_degree_II_2: 1000 V; Rated_current_min_no_of_poles_TU_20_deg_C: 150 A; Solid_min_H05_07_V_U: 0,5 mm²; Solid_max_H05_07_V_U: 16 mm²; Rated_voltage_use_group_B_UL_1059: 600 V; Rated_current_use_group_B_UL_1059: 127 A; Wire_cross_section_AWG_min_UL_1059: AWG 20; Wire_cross_section_AWG_max_UL_1059: AWG 1; PackageReference: LXXX_15_00_90F_02; Colour: Pebble grey; Packaging: Box; Qty: 20 PCS; Revision: V1; ComponentLink1Description: Manufacturer URL; ComponentLink1URL: http://www.weidmueller.com/; ComponentLink2Description: URL Link1; ComponentLink2URL: http://catalog.weidmueller.com/catalog/Start.do?localeId=en&ObjectID=1047370000
footprint LXXX_15_00_90F_02 (OMNIMATE Power - Serie LXXX  LXXX 15.00/02/90F 4.5)
part A pins: A1
part B pins: A2
1 alternate drawing of the same symbol